# Altium footprint library Atlan.PcbLib: 283 footprints (part 5 of 18)
Each footprint in its own frame and in the unit in brackets; x right, y up, seen from the top. Pads: shape width x height; smd on the part's side, far side on the other; paste and mask are expansions set on the pad; w line width, h text height; cw(c..) or ccw(c..) is an arc to the next point about the centre after c.
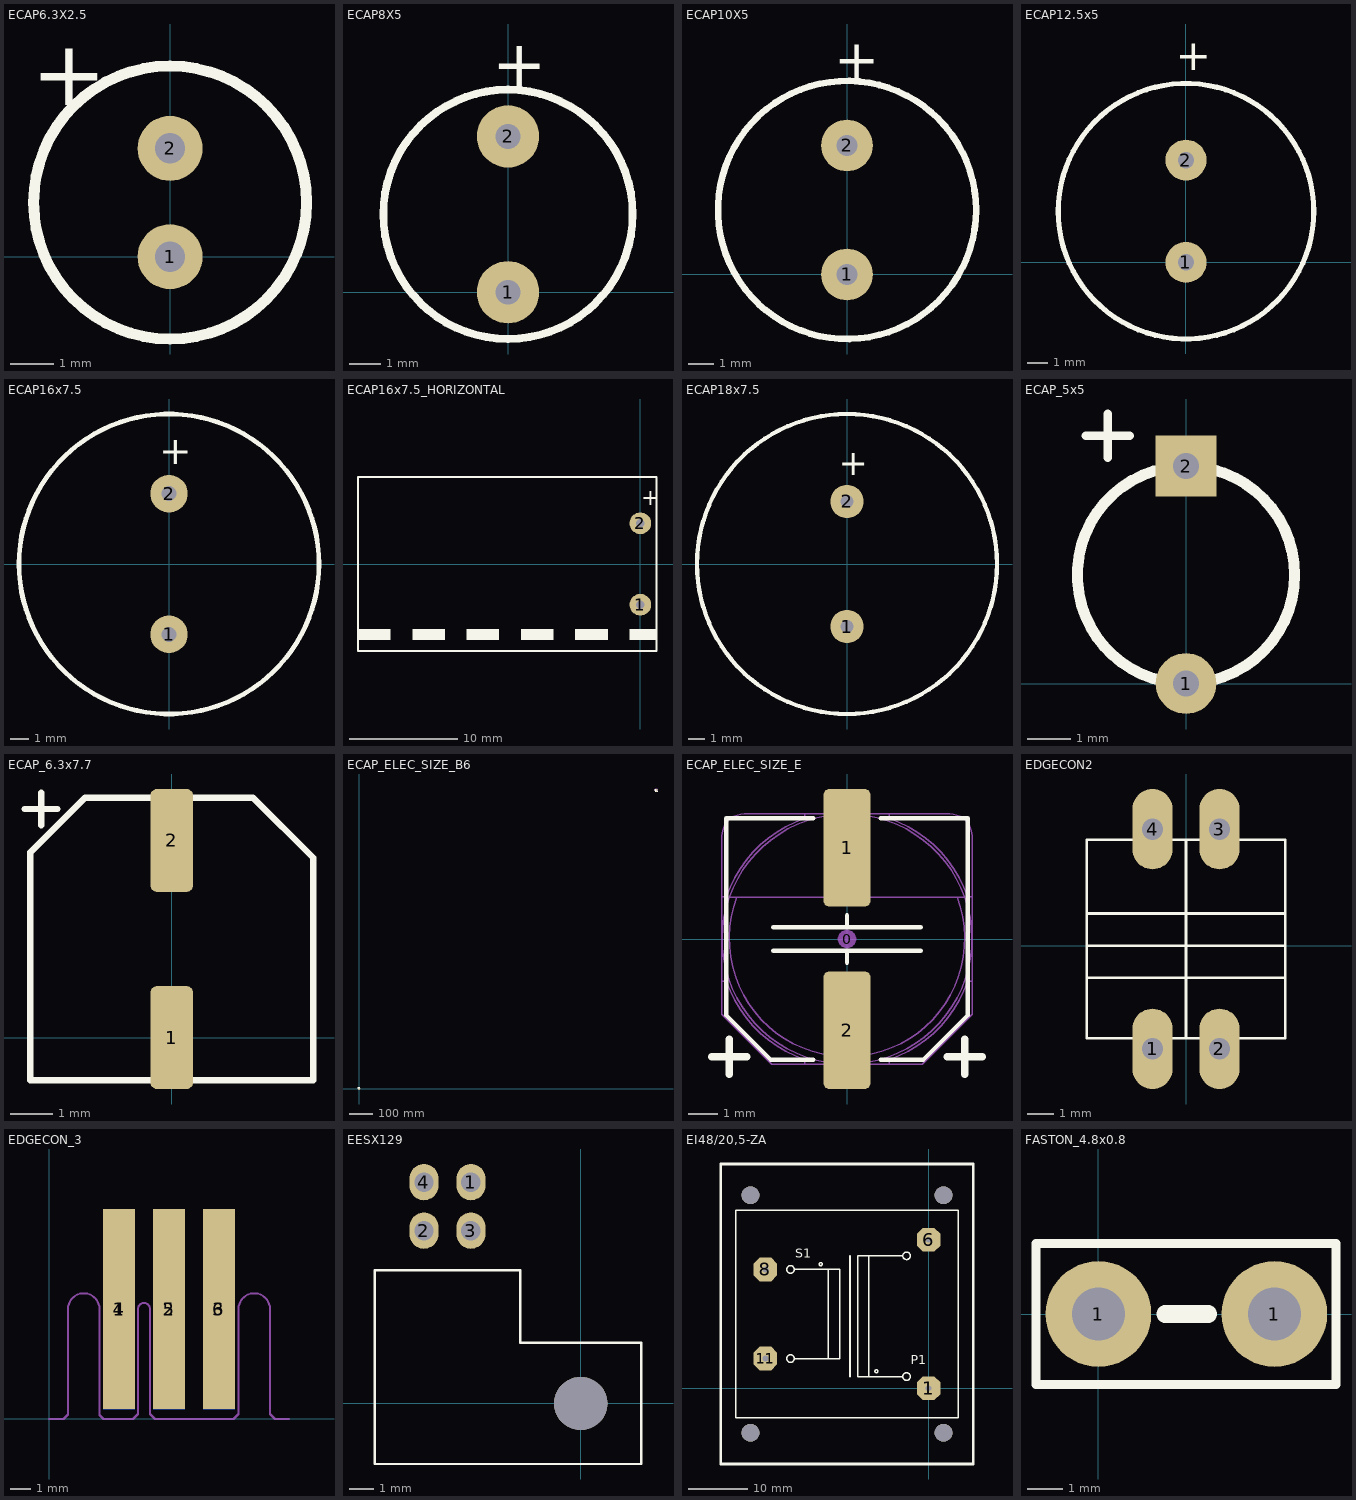
[diagram p4: the footprints below, top view; thin cyan lines are the x and y axes]

## ECAP6.3X2.5 [mm] "Elcap"
height 11
pads (2):
  round 1.5 hole 0.7: 1(0,0) 2(0,2.5)
Top Overlay:
  circle w0.254: c0,1.25 r3.15
  text "+" at -3.2,3.5 h1.52
3D body: height 11, standoff 0, extent -3.125,-1.844 3.15,4.444

## ECAP8X5 [mm] "Elcap"
height 20
pads (2):
  round 2 hole 0.8: 1(0,0) 2(0,5)
Top Overlay:
  circle w0.254: c0,2.5 r4
  text "+" at -0.5,6.6 h1.52
3D body: height 11.5, standoff 0, extent -4,-1.492 3.968,6.492

## ECAP10X5 [mm] "Elcap"
height 20
pads (2):
  round 2 hole 0.8: 1(0,0) 2(0,5)
Top Overlay:
  circle w0.254: c0,2.5 r5
  text "+" at -0.5,7.6 h1.52
3D body: height 12.5, standoff 0, extent -4.961,-2.49 5,7.49

## ECAP12.5x5 [mm] "Elcap"
height 20
pads (2):
  round 2 hole 0.8: 1(0,0) 2(0,5)
Top Overlay:
  circle w0.254: c0,2.5 r6.25
  text "+" at -0.5,9.4 h1.52
3D body: height 12.5, standoff 0, extent -6.25,-3.747 6.25,8.747

## ECAP16x7.5 [mm] "Elcap"
height 25
pads (2):
  round 2 hole 0.8: 1(0,-3.75) 2(0,3.75)
Top Overlay:
  circle w0.254: c0,0 r8.001
  text "+" at -0.508,5.334 h1.52
3D body: height 25, standoff 0, extent -7.937,-7.984 8,7.984

## ECAP16x7.5_HORIZONTAL [mm] "Electrolitic Cap"
height 16
pads (2):
  round 2 hole 0.8: 1(0,-3.75) 2(0,3.75)
Top Overlay:
  rectangle: -1,-7 1.5,-6
  rectangle: -6,-7 -3,-6
  rectangle: -11,-7 -8,-6
  rectangle: -16,-7 -13,-6
  rectangle: -21,-7 -18,-6
  rectangle: -26,-7 -23,-6
  lines w0.2: -26,-8 1.5,-8 1.5,8 -26,8 -26,-8
  text "+" at 0.1,5.4 h1.52
3D body: height 15.94, standoff 0, extent -25.5,-8 -0.5,7.968
3D body: height 8, standoff 0, extent -0.397,3.351 0.4,4.149
3D body: height 8, standoff 0, extent -0.397,-4.149 0.4,-3.351

## ECAP18x7.5 [mm] "Elcap"
height 36
pads (2):
  round 2 hole 0.8: 1(0,-3.75) 2(0,3.75)
Top Overlay:
  circle w0.254: c0,0 r9
  text "+" at -0.508,5.334 h1.52
3D body: height 36, standoff 0, extent -8.929,-8.982 9,8.982

## ECAP_5x5 [mm] "Elcap"
height 11
pads (2):
  round 1.4 hole 0.6: 1(0,0)
  rect 1.4x1.4 hole 0.6: 2(0,5)
Top Overlay:
  circle w0.254: c0,2.5 r2.5
  lines w0.203: -2.3,5.7 -1.3,5.7 ; -1.8,5.2 -1.8,6.2
3D body: height 11, standoff 0, extent -2.5,0 2.48,4.99

## ECAP_6.3x7.7 [mm]
pads (2):
  rrect30% 1x2.4 smd: 1(0,0) 2(0,4.6)
Top Overlay:
  lines w0.15: -3.429,5.334 -2.667,5.334 ; -3.048,4.953 -3.048,5.715 ; -3.3,-1 -3.3,4.32 -2.02,5.6 1.893,5.6 3.3,4.193 3.3,-1 -3.3,-1
3D body: height 7.7, standoff 0, extent -3.274,-1.007 3.3,5.58

## ECAP_ELEC_SIZE_B6 [mm] "Capacitor, polarized, aluminum can; 8.0x6.2mm DxH"
height 6.2
pads (5):
  round 0.635 on Mech15: 0(1268.476,1272.54)
  rrect50% 0.8x2.3 smd: 1(0,0) 2(0,3.7)
  rrect25% 1.6x4 smd: 1(1268.476,1275.64) 2(1268.476,1269.44)
Top Overlay:
  lines w0.1: -0.635,-1.143 -1.905,-1.143 -2.65,-0.398 -2.65,4.826 -0.635,4.826 ; 0.635,-1.143 1.905,-1.143 2.65,-0.398 2.65,4.826 0.635,4.826
  lines w0.152: 1265.976,1272.14 1270.976,1272.14 ; 1265.976,1272.94 1270.976,1272.94 ; 1267.326,1268.44 1265.876,1268.44 1264.376,1269.94 1264.376,1276.64 1267.326,1276.64 ; 1268.476,1271.74 1268.476,1272.14 ; 1268.476,1272.94 1268.476,1273.34 ; 1269.626,1268.44 1271.076,1268.44 1272.576,1269.94 1272.576,1276.64 1269.626,1276.64
  lines w0.254: 1263.876,1268.54 1265.076,1268.54 ; 1264.476,1267.94 1264.476,1269.14 ; 1271.876,1268.54 1273.076,1268.54 ; 1272.476,1267.94 1272.476,1269.14
  text "+" at -1.27,-2.032 h0.75
Mechanical 13:
  lines w0.05: 1264.226,1271.104 1264.37,1271.104 ccw(c1268.476,1272.54) 1267.04,1268.434 1267.04,1268.29 ; 1264.226,1273.976 1264.37,1273.976 cw(c1268.476,1272.54) 1267.04,1276.646 1267.04,1276.79 ; 1264.471,1273.957 cw(c1268.476,1272.54) 1272.481,1273.957 ; 1264.735,1273.957 ccw(c1268.476,1272.54) 1272.217,1273.957 ; 1268.151,1268.29 1268.151,1267.79 1268.801,1267.79 1268.801,1268.29 ; 1268.151,1276.79 1268.151,1277.29 1268.801,1277.29 1268.801,1276.79 ; 1269.912,1268.29 1269.912,1268.434 ccw(c1268.476,1272.54) 1272.582,1271.104 1272.726,1271.104 ; 1269.912,1276.79 1269.912,1276.646 cw(c1268.476,1272.54) 1272.582,1273.976 1272.726,1273.976 ; 1264.226,1269.99 1265.926,1268.29 1271.026,1268.29 1272.726,1269.99 1272.726,1276.04 ccw(c1271.976,1276.04) 1271.976,1276.79 1264.976,1276.79 ccw(c1264.976,1276.04) 1264.226,1276.04 1264.226,1269.99 ; 1264.469,1273.957 ccw(c1268.476,1272.54) 1272.483,1273.957 1264.469,1273.957
3D body "CAP Alum Elec Size E.STEP": height 6.5, standoff 0, extent 1264.226,1267.79 1272.726,1277.29
3D body: height 5.9, standoff 0, extent -2.48,-0.59 2.5,4.4

## ECAP_ELEC_SIZE_E [mm] "Capacitor, polarized, aluminum can; 8.0x6.2mm DxH"
height 6.2
pads (3):
  round 0.635 on Mech15: 0(0,0)
  rrect25% 1.6x4 smd: 1(0,3.1) 2(0,-3.1)
Top Overlay:
  lines w0.152: -2.5,-0.4 2.5,-0.4 ; -2.5,0.4 2.5,0.4 ; -1.15,-4.1 -2.6,-4.1 -4.1,-2.6 -4.1,4.1 -1.15,4.1 ; 0,-0.8 0,-0.4 ; 0,0.4 0,0.8 ; 1.15,-4.1 2.6,-4.1 4.1,-2.6 4.1,4.1 1.15,4.1
  lines w0.254: -4.6,-4 -3.4,-4 ; -4,-4.6 -4,-3.4 ; 3.4,-4 4.6,-4 ; 4,-4.6 4,-3.4
Mechanical 13:
  lines w0.05: -4.25,-1.436 -4.106,-1.436 ccw(c0,0) -1.436,-4.106 -1.436,-4.25 ; -4.25,1.436 -4.106,1.436 cw(c0,0) -1.436,4.106 -1.436,4.25 ; -4.005,1.417 cw(c0,0) 4.005,1.417 ; -3.741,1.417 ccw(c0,0) 3.741,1.417 ; -0.325,-4.25 -0.325,-4.75 0.325,-4.75 0.325,-4.25 ; -0.325,4.25 -0.325,4.75 0.325,4.75 0.325,4.25 ; 1.436,-4.25 1.436,-4.106 ccw(c0,0) 4.106,-1.436 4.25,-1.436 ; 1.436,4.25 1.436,4.106 cw(c0,0) 4.106,1.436 4.25,1.436 ; -4.25,-2.55 -2.55,-4.25 2.55,-4.25 4.25,-2.55 4.25,3.5 ccw(c3.5,3.5) 3.5,4.25 -3.5,4.25 ccw(c-3.5,3.5) -4.25,3.5 -4.25,-2.55 ; -4.007,1.417 ccw(c0,0) 4.007,1.417 -4.007,1.417
3D body "CAP Alum Elec Size E.STEP": height 6.5, standoff 0, extent -4.25,-4.75 4.25,4.75

## EDGECON2 [mm]
pads (4):
  oval 1.5x3 hole 0.8: 1(-1.25,-3.85) 2(1.25,-3.85) 3(1.25,4.35) 4(-1.25,4.35)
Top Overlay:
  lines w0.1: -3.7,-1.2 3.7,-1.2 ; -3.7,0 3.7,0 ; -3.7,1.2 3.7,1.2 ; 0,-3.45 0,3.95 ; -3.7,-3.45 -3.7,3.95 3.7,3.95 3.7,-3.45 -3.7,-3.45

## EDGECON_3 [mm]
pads (6):
  rect 1.6x10 smd: 1(3.488,5.5) 2(5.988,5.5) 3(8.488,5.5)
  rect 1.6x10 smd far side: 4(3.488,5.5) 5(5.988,5.5) 6(8.488,5.5)
Mechanical 1:
  lines w0.1: 0,0 0.713,0 0.938,0.225 ; 2.513,0.25 2.513,0.2 ; 12,0 11.288,0 11.038,0.25 11.038,5.5 ccw(c10.25,5.5) 9.463,5.5 9.463,0.25 9.213,0 5.288,0 5.038,0.25 5.038,5.5 ccw(c4.738,5.5) 4.438,5.5 4.438,0.25 4.188,0 2.713,0 2.513,0.2 ; 0.938,0.225 0.938,0.25 0.938,0.225 ; 0.938,0.225 0.938,5.5 cw(c1.725,5.5) 2.512,5.5 2.513,0.2

## EESX129 [mm]
pads (5):
  oval 1.2x1.5 hole 0.8: 1(-4.53,9.136) 2(-6.47,7.136) 3(-4.53,7.136) 4(-6.47,9.136)
  round 2.2 hole 2.2 unplated: ""(0,0)
Top Overlay:
  lines w0.1: -8.5,-2.5 2.5,-2.5 2.5,2.5 -2.5,2.5 -2.5,5.5 -8.5,5.5 -8.5,-2.5
3D body: height 13, standoff 0, extent -8.5,-2.5 2.5,5.5

## EI48/20,5-ZA [mm]
pads (8):
  oct 4x4 hole 1: 1(0,0) 6(0,25) 8(-27.5,20) 11(-27.5,5)
  round 3 hole 3 unplated: ""(-30,-7.5) ""(-30,32.5) ""(2.5,-7.5) ""(2.5,32.5)
Top Overlay:
  drawing of 287 lines, arcs and shapes, not listed
  text "P1" at -3,4 h1.52
  text "S1" at -22.5,22 h1.52

## FASTON_4.8x0.8 [mm]
pads (2):
  round 3 hole 1.5: 1(0,0) 1(5,0)
Top Overlay:
  lines w0.254: -1.775,-2 6.75,-2 6.75,2 -1.775,2 -1.775,-2
  lines w0.5: 1.9,0 3.125,0
3D body "Faston PCB TAB 4_8x0_8x13_5.STEP": height 9, standoff -4.8, extent -0.65,-0.4 5.65,0.4